# Altium footprint library nira_avr_dev_board.PcbLib: 49 footprints (part 4 of 4)
Each footprint in its own frame and in the unit in brackets; x right, y up, seen from the top. Pads: shape width x height; smd on the part's side, far side on the other; paste and mask are expansions set on the pad; w line width, h text height; cw(c..) or ccw(c..) is an arc to the next point about the centre after c.
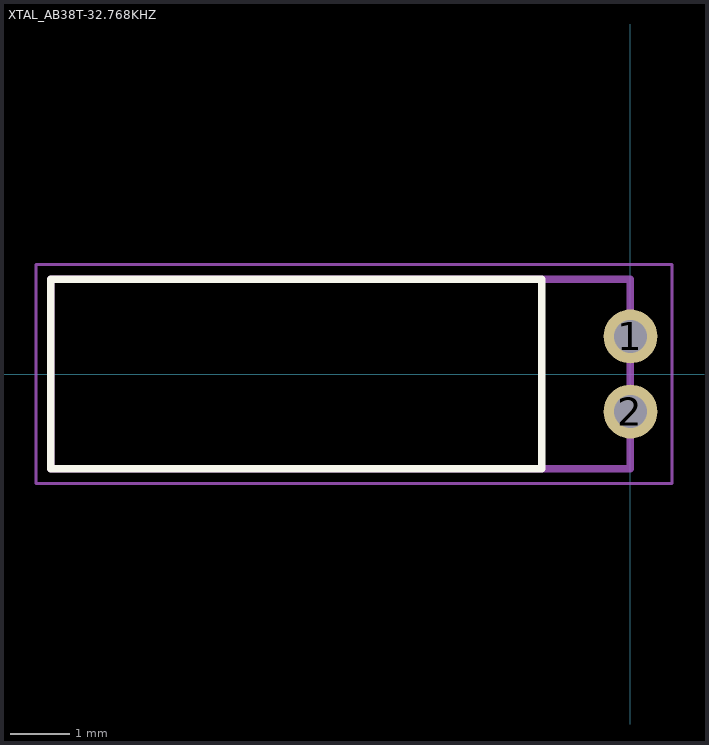
[diagram p3: the footprint, top view; thin cyan lines are the x and y axes]

## XTAL_AB38T-32.768KHZ [mm]
height 3.2
pads (2):
  round 0.91 hole 0.56: 1(0,0.635) 2(0,-0.635)
Top Overlay:
  lines w0.127: -9.8,-1.6 -9.8,1.6 -1.5,1.6 -1.5,-1.6 -9.8,-1.6
Mechanical 13:
  lines w0.127: -9.8,-1.6 -9.8,1.6 0,1.6 0,-1.6 -9.8,-1.6
Mechanical 15:
  lines w0.05: -10.05,-1.85 -10.05,1.85 0.705,1.85 0.705,-1.85 -10.05,-1.85